# Altium footprint library Binh.PcbLib: 863 footprints (part 51 of 54)
Each footprint in its own frame and in the unit in brackets; x right, y up, seen from the top. Pads: shape width x height; smd on the part's side, far side on the other; paste and mask are expansions set on the pad; w line width, h text height; cw(c..) or ccw(c..) is an arc to the next point about the centre after c.
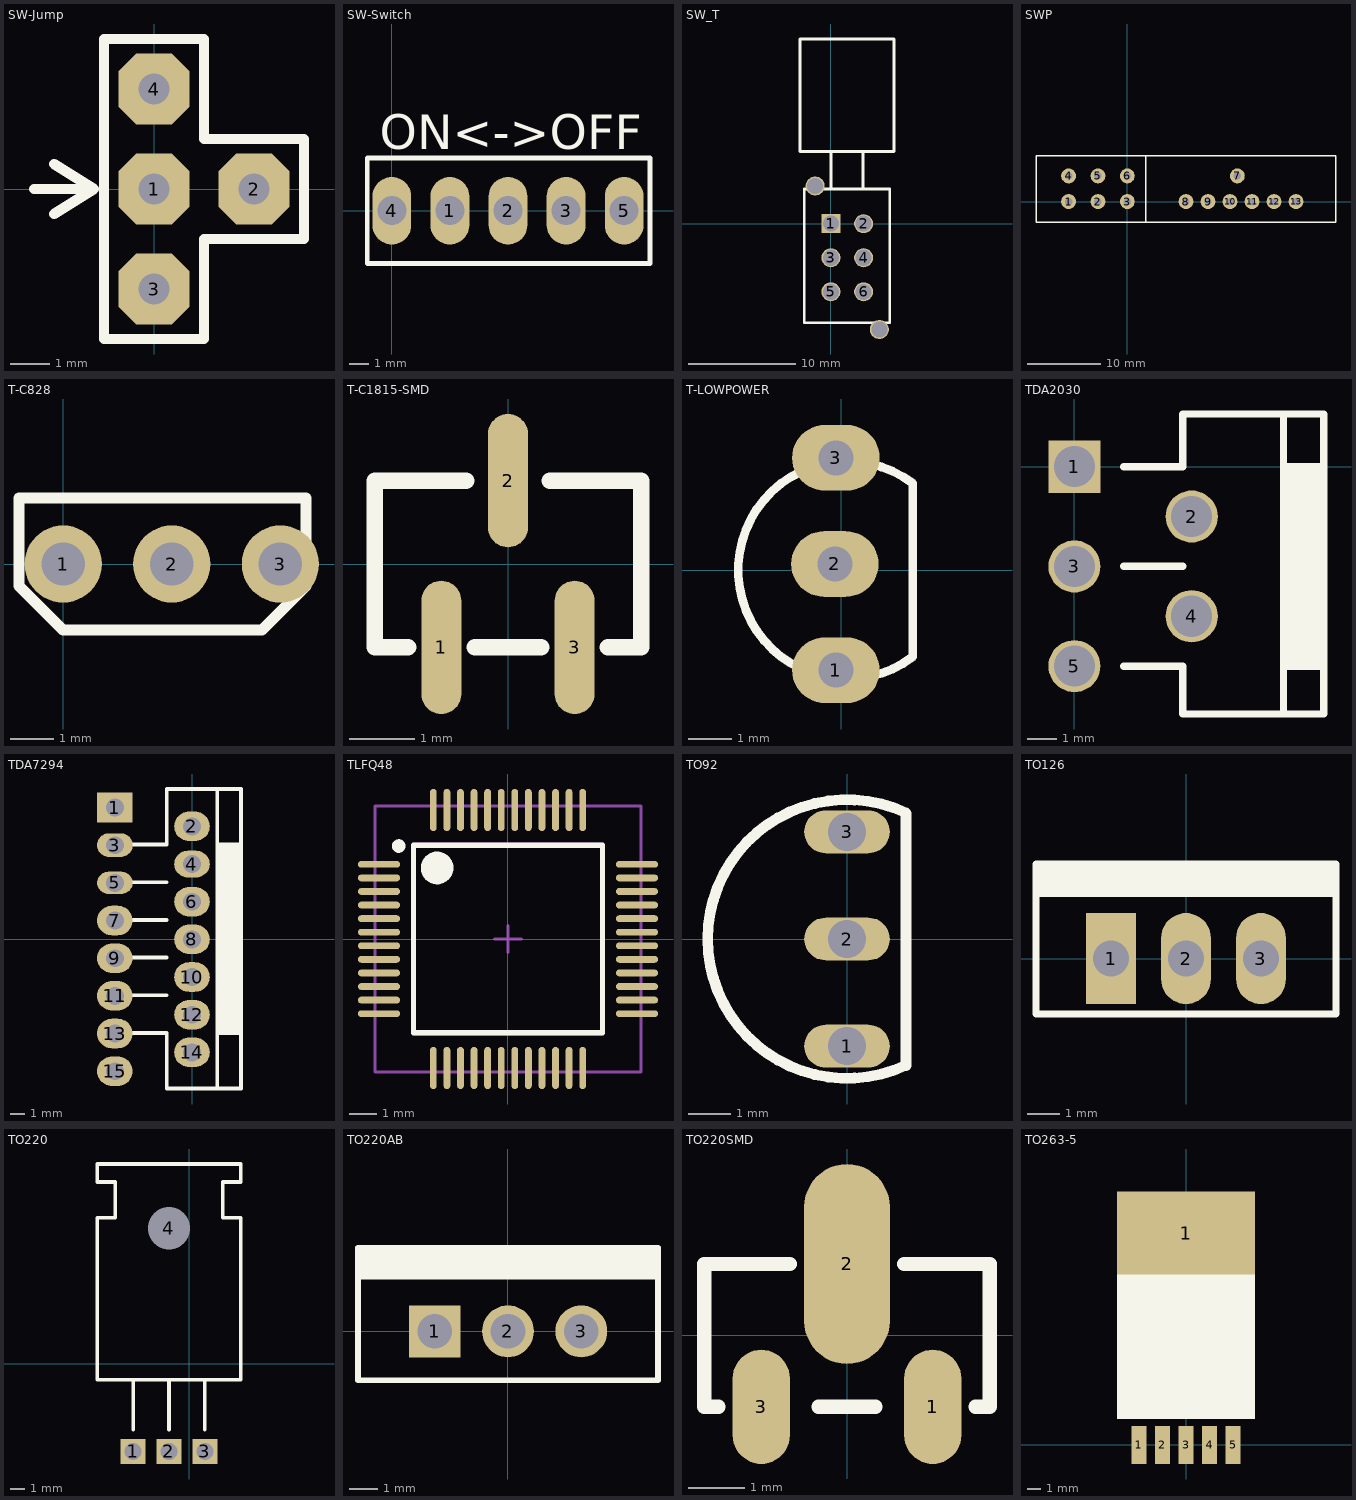
[diagram p50: the footprints below, top view; thin cyan lines are the x and y axes]

## SW-Jump [mm]
pads (4):
  oct 1.8x1.8 hole 0.8: 1(0,0) 2(2.54,0) 3(0,-2.54) 4(0,2.54)
Top Overlay:
  lines w0.254: -3.048,0 -1.524,0 ; -2.54,-0.635 -1.524,0 ; -2.54,0.635 -1.524,0 ; -1.27,-3.81 -1.27,1.27 -1.27,-1.27 -1.27,3.81 1.27,3.81 1.27,1.27 3.81,1.27 3.81,-1.27 1.27,-1.27 1.27,-3.81 -1.27,-3.81

## SW-Switch [mm]
pads (5):
  oval 2x3.5 hole 1.5: 1(3,0) 2(6,0) 3(9,0) 4(0,0) 5(12,0)
Top Overlay:
  lines w0.254: -1.27,-2.73 -1.27,2.73 13.335,2.73 13.335,-2.73 -1.27,-2.73
  text "ON<->OFF" at -0.635,3.175 h1.8
3D body "User Library-Assem1-20.STEP": height 2.6, standoff -6, extent -0.5,-2.85 12.5,9.35

## SW_T [mil]
pads (8):
  rect 70x70 hole 59.06 unplated: 1(0,0)
  round 70 hole 59.06 unplated: 2(120.08,0) 3(0,-125.2) 4(120.08,-125.2) 5(0,-250.39) 6(120.08,-250.39) ""(-58,138.58) ""(178,-388.98)
Top Overlay:
  lines w10: 0,127.95 0,265.8 ; 84,127.95 118.11,127.95 118.11,265.8 ; -114.17,265.8 232.28,265.8 232.28,679.18 59.06,679.18 -114.17,679.18 -114.17,265.8 ; -98.43,-364.17 216.54,-364.17 216.54,127.95 108,127.95 -98.43,127.95 -98.43,-364.17

## SWP [mil] "SW Power"
height 100
pads (13):
  round 80 hole 40: 1(-314.96,0) 2(-157.48,0) 3(0,0) 4(-314.96,137.8) 5(-157.48,137.8) 6(0,137.8) 7(590.55,137.8) 8(314.96,0) 9(433.07,0) 10(551.18,0) 11(669.29,0) 12(787.4,0) 13(905.51,0)
Top Overlay:
  lines w8: 100,-109.33 100,245 ; -490,-110 -490,245 1120,245 1120,-110 -490,-110

## T-C828 [mil]
pads (3):
  round 70 hole 39.37 unplated: 1(0,0) 2(98.43,0) 3(196.85,0)
Top Overlay:
  lines w10: -40,-20 -40,60 180,60 220,60 220,-20 180,-60 140,-60 0,-60 -40,-20

## T-C1815-SMD [mil]
pads (3):
  oval 24x80 smd: 1(-40,-50) 2(0,50) 3(40,-50)
Top Overlay:
  lines w10: -60,-50 -80,-50 -80,50 -60,50 -25,50 ; -20,-50 20,-50 ; 25,50 80,50 80,-50 60,-50

## T-LOWPOWER [mm] "TO, Flat Index; 3 In-Line, Axial Leads; Body Dia. 4.5mm; Leads 0.51 x 0.48 mm (max)"
height 6.86
pads (3):
  oval 2x1.5 hole 0.8: 1(-0.127,-2.286) 2(-0.151,0.139) 3(-0.127,2.564)
Top Overlay:
  lines w0.2: 1.627,-1.98 cw(c0.127,0) 1.627,1.98 1.627,-1.98
3D body "BJT.step": height 11, standoff -1, extent -2.476,-2.794 1.524,3.006

## TDA2030 [mm]
pads (5):
  rect 1.778x1.778 hole 1.4 unplated: 1(0,0)
  round 1.778 hole 1.4 unplated: 2(4,-1.7) 3(0,-3.4) 4(4,-5.1) 5(0,-6.8)
Top Overlay:
  rectangle: 7.13,-6.807 8.5,0
  lines w0.254: 1.676,-6.8 3.7,-6.8 3.7,-8.433 8.5,-8.433 8.5,-3.404 8.5,1.796 3.7,1.796 3.7,0 1.676,0 ; 1.676,-3.4 3.7,-3.4 ; 7.13,-8.433 7.13,0 ; 7.13,-6.8 8.5,-6.8 ; 7.13,1.796 7.13,0 ; 8.5,0 7.13,0

## TDA7294 [mm]
pads (15):
  rect 2.4x2 hole 1.2: 1(-5.219,8.889)
  oval 2.4x2 hole 1.2: 2(-0.019,7.619) 6(-0.019,2.539) 7(-5.219,1.269) 8(-0.019,-0.001) 9(-5.219,-1.271) 10(-0.019,-2.541) 11(-5.219,-3.811) 12(-0.019,-5.081) 13(-5.219,-6.351) 14(-0.019,-7.621) 15(-5.219,-8.891)
  oval 2.4x1.6 hole 1.2: 3(-5.219,6.349)
  oval 2.4x1.8 hole 1.2: 4(-0.019,5.079)
  oval 2.4x1.5 hole 1.2: 5(-5.219,3.809)
Top Overlay:
  rectangle: 1.681,-6.26 3.281,6.389
  lines w0.254: -4.742,-6.311 -1.719,-6.311 ; -4.742,-3.771 -1.719,-3.771 ; -4.742,-1.231 -1.719,-1.231 ; -4.742,1.309 -1.719,1.309 ; -4.742,3.849 -1.719,3.849 ; -4.742,6.389 -1.719,6.389 -1.719,10.139 3.281,10.139 3.281,0.039 3.281,-10.061 -1.719,-10.061 -1.719,-6.311 ; -1.719,-7.682 -1.719,-6.311 ; 1.681,-10.061 1.681,8.625 1.681,10.139 ; 1.681,-6.311 3.281,-6.311 3.281,-8.241 ; 1.681,6.389 3.281,6.389

## TLFQ48 [mm] "48-Pin Thin Quad Flat Pack 0.5 mm Pitch, IPC High Density"
height 1.6
pads (48):
  oval 1.55x0.25 smd: 1(-4.75,2.75) 2(-4.75,2.25) 3(-4.75,1.75) 4(-4.75,1.25) 5(-4.75,0.75) 6(-4.75,0.25) 7(-4.75,-0.25) 8(-4.75,-0.75) 9(-4.75,-1.25) 10(-4.75,-1.75) 11(-4.75,-2.25) 12(-4.75,-2.75) 25(4.75,-2.75) 26(4.75,-2.25) 27(4.75,-1.75) 28(4.75,-1.25) 29(4.75,-0.75) 30(4.75,-0.25) 31(4.75,0.25) 32(4.75,0.75) 33(4.75,1.25) 34(4.75,1.75) 35(4.75,2.25) 36(4.75,2.75)
  oval 0.25x1.55 smd: 13(-2.75,-4.75) 14(-2.25,-4.75) 15(-1.75,-4.75) 16(-1.25,-4.75) 17(-0.75,-4.75) 18(-0.25,-4.75) 19(0.25,-4.75) 20(0.75,-4.75) 21(1.25,-4.75) 22(1.75,-4.75) 23(2.25,-4.75) 24(2.75,-4.75) 37(2.75,4.75) 38(2.25,4.75) 39(1.75,4.75) 40(1.25,4.75) 41(0.75,4.75) 42(0.25,4.75) 43(-0.25,4.75) 44(-0.75,4.75) 45(-1.25,4.75) 46(-1.75,4.75) 47(-2.25,4.75) 48(-2.75,4.75)
Top Overlay:
  circle w0.25: c-4.025,3.425 r0.125
  circle w0.6: c-2.611,2.616 r0.3
  lines w0.2: -3.48,-3.454 -3.48,3.454 3.48,3.454 3.48,-3.454 -3.48,-3.454
Mechanical 13:
  circle w0.1: c-2.6,2.6 r0.5
  lines w0.1: -3.5,-3.5 -3.5,3.5 3.5,3.5 3.5,-3.5 -3.5,-3.5
Mechanical 15:
  lines w0.1: -0.5,0 0.5,0 ; 0,-0.5 0,0.5 ; -4.9,-4.9 -4.9,4.9 4.9,4.9 4.9,-4.9 -4.9,-4.9
3D body: height 1.6, standoff 0, extent -3.5,-3.5 3.5,3.5

## TO92 [mil] "TO, Flat Index; 3 In-Line, Axial Leads; Body Dia. 4.8mm"
pads (3):
  oval 80x40 hole 35.43: 1(0,-100) 2(0,0) 3(0,100)
Top Overlay:
  lines w10: 54.92,-117.83 cw(c0,0) 54.92,117.83 ; 55,-118 55,117

## TO126 [mil] "TO, Thru-Hole, Vertical, Heatsink Mounted; 3 In-Line Leads; Pitch 2.54 mm; Pin sequence 1, 3, 2"
height 645.67
pads (3):
  rect 60x110 hole 43.31: 1(-90.55,0)
  oval 60x110 hole 43.31: 2(0,0) 3(90.55,0)
Top Overlay:
  rectangle: -181.1,74.49 181.1,114.17
  lines w7.87: -181.1,-66.93 181.1,-66.93 181.1,114.17 -181.1,114.17 -181.1,-66.93

## TO220 [mil]
pads (4):
  rect 70x70 hole 47.24 unplated: 1(-155.83,-244.49) 2(-55.83,-244.49) 3(44.17,-244.49)
  round 70 hole 118.11 unplated: 4(-55.83,376.77)
Top Overlay:
  lines w10: -155.83,-184.49 -155.83,-44.49 ; -55.83,-184.49 -55.83,-44.49 ; 44.17,-184.49 44.17,-44.49 ; -255.83,-44.49 144.17,-44.49 144.17,405.51 94.17,405.51 94.17,505.51 144.17,505.51 144.17,555.51 -255.83,555.51 -255.83,505.51 -205.83,505.51 -205.83,405.51 -255.83,405.51 -255.83,-44.49

## TO220AB [mm] "TO, Thru-Hole, Vertical, Heatsink Mounted; 3 In-Line Leads; Pitch 2.54 mm; Pin sequence 1, 3, 2"
height 16.4
pads (3):
  rect 1.8x1.8 hole 1.2: 1(-2.54,0)
  round 1.8 hole 1.2: 2(0,0) 3(2.54,0)
Top Overlay:
  rectangle: -5.2,1.892 5.2,2.9
  lines w0.2: -5.2,1.892 5.2,1.892 ; -5.2,-1.7 -5.2,2.9 5.2,2.9 5.2,-1.7 -5.2,-1.7

## TO220SMD [mil]
pads (3):
  oval 40x80 smd: 1(60,-50) 3(-60,-50)
  oval 60x140 smd: 2(0,50)
Top Overlay:
  lines w10: -90,-50 -100,-50 -100,50 -60,50 -40,50 ; -20,-50 20,-50 ; 40,50 100,50 100,-50 90,-50

## TO263-5 [mm] "LM2576-SMD"
pads (6):
  rect 1.07x2.75 smd: 1(-3.4,-0.025) 2(-1.7,-0.025) 3(0,-0.025) 4(1.7,-0.025) 5(3.4,-0.025)
  rect 10x6 smd: 1(0,15.289)
Top Overlay:
  rectangle: -5,1.854 5,12.878
3D body "SW3dPS-TO263-5.STEP": height 4.79, standoff -0.01, extent -5,-0.381 5,15.289